# Altium schematic symbol library AA_Symbols.SchLib: 1017 symbols (part 3 of 7) (continued)
## HW_6U_Panel_Generic (continued)
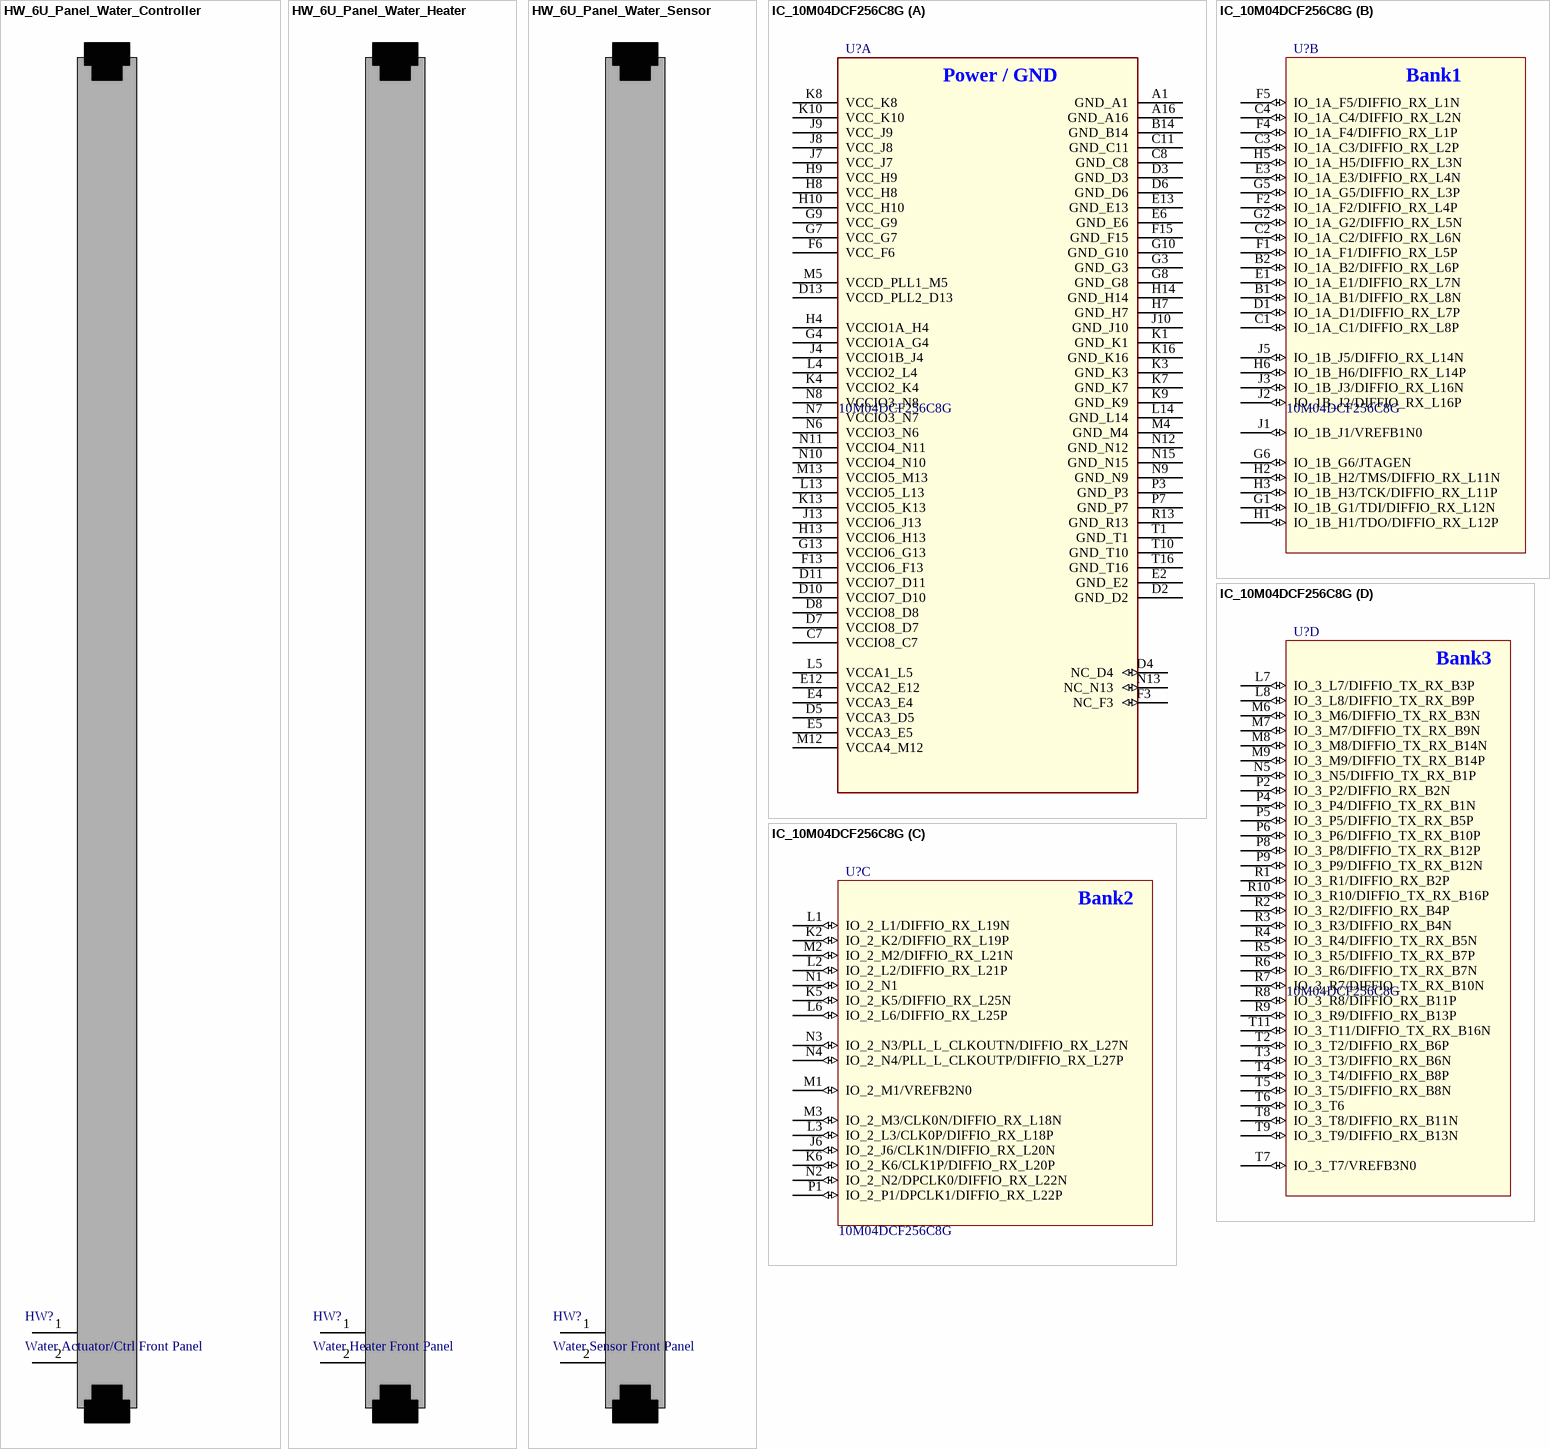
[diagram p14: symbols HW_6U_Panel_Water_Controller to IC_10M04DCF256C8G]

## HW_6U_Panel_Water_Controller
designator HW?, comment Water Actuator/Ctrl Front Panel
Hardware, 6 Rack Unit Tall Front Panel For Water Actuator and Control Card; Outset P/N: PN-0001928
footprint NUV_TPH1R005PL,L1Q_SOTFL127P600X100-8N (Small Outline Transistor Flat Lead (SOP Advance), 1.27 mm pitch; 8 pin, 5.0 mm L X 5.0 mm W X 1.0 mm H body)
footprint 6U_PNL_MTG (Footprint not found)
pins: 1, 2

## HW_6U_Panel_Water_Heater
designator HW?, comment Water Heater Front Panel
Hardware, 6 Rack Unit Tall Front Panel For Water Heater Card, Ejector Handles, Key; Outset P/N: PN-0001927
footprint NUV_TPH1R005PL,L1Q_SOTFL127P600X100-8N (Small Outline Transistor Flat Lead (SOP Advance), 1.27 mm pitch; 8 pin, 5.0 mm L X 5.0 mm W X 1.0 mm H body)
footprint 6U_PNL_MTG (Footprint not found)
pins: 1, 2

## HW_6U_Panel_Water_Sensor
designator HW?, comment Water Sensor Front Panel
Hardware, 6 Rack Unit Tall Front Panel For Water Sensor Card, Ejector Handles, Key; Outset P/N: PN-0001930
footprint NUV_TPH1R005PL,L1Q_SOTFL127P600X100-8N (Small Outline Transistor Flat Lead (SOP Advance), 1.27 mm pitch; 8 pin, 5.0 mm L X 5.0 mm W X 1.0 mm H body)
footprint 6U_PNL_MTG (Footprint not found)
pins: 1, 2

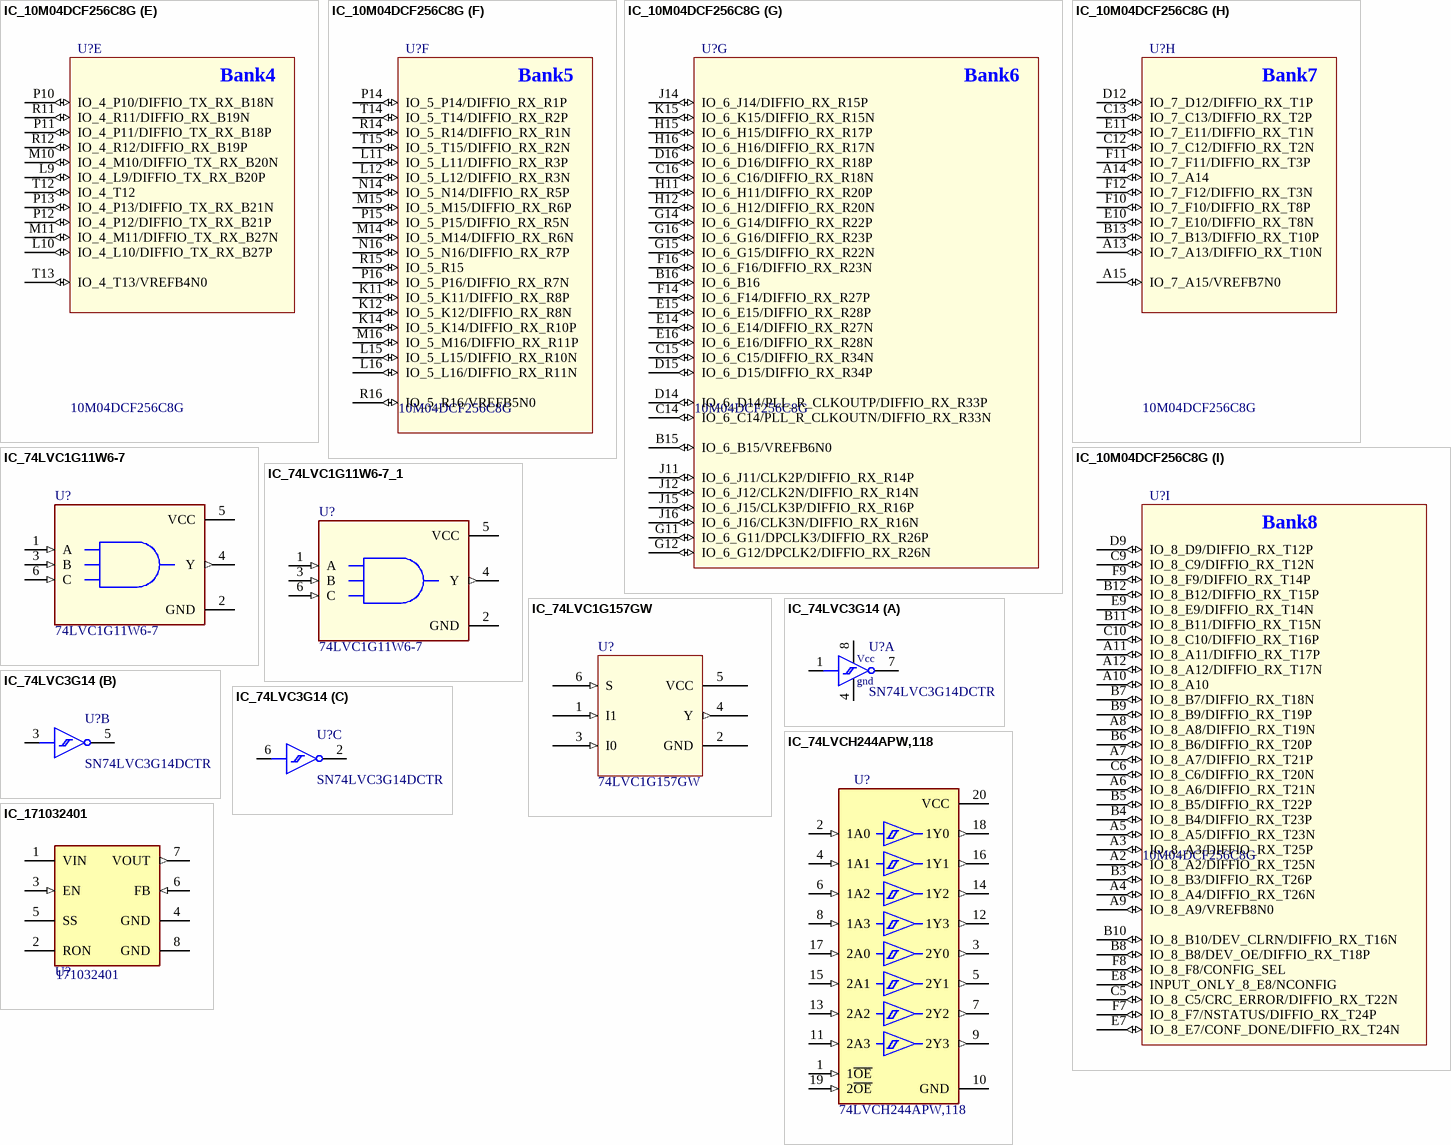
[diagram p15: symbols IC_10M04DCF256C8G to IC_171032401]

## IC_10M04DCF256C8G
designator U?, comment 10M04DCF256C8G
IC, FPGA MAX 10 Family, 256-Pin FBGA, 10M04DCF256C8G; Manufacturer: Intel; Outset P/N: PN-0006891; Manufacturer P/N: 10M04DCF256C8G; VALUE: 10M04DCF256C8G
footprint BGA256CP100_16X16_1700X1700X155B50N
part A pins: A1 GND_A1 (power), A16 GND_A16 (power), B14 GND_B14 (power), C7 VCCIO8_C7 (power), C8 GND_C8 (power), C11 GND_C11 (power), D2 GND_D2 (power), D3 GND_D3 (power), D4 NC_D4 (io), D5 VCCA3_D5 (power), D6 GND_D6 (power), D7 VCCIO8_D7 (power), D8 VCCIO8_D8 (power), D10 VCCIO7_D10 (power), D11 VCCIO7_D11 (power), D13 VCCD_PLL2_D13 (power), E2 GND_E2 (power), E4 VCCA3_E4 (power), E5 VCCA3_E5 (power), E6 GND_E6 (power), E12 VCCA2_E12 (power), E13 GND_E13 (power), F3 NC_F3 (io), F6 VCC_F6 (power), F13 VCCIO6_F13 (power), F15 GND_F15 (power), G3 GND_G3 (power), G4 VCCIO1A_G4 (power), G7 VCC_G7 (power), G8 GND_G8 (power), G9 VCC_G9 (power), G10 GND_G10 (power), G13 VCCIO6_G13 (power), H4 VCCIO1A_H4 (power), H7 GND_H7 (power), H8 VCC_H8 (power), H9 VCC_H9 (power), H10 VCC_H10 (power), H13 VCCIO6_H13 (power), H14 GND_H14 (power), J4 VCCIO1B_J4 (power), J7 VCC_J7 (power), J8 VCC_J8 (power), J9 VCC_J9 (power), J10 GND_J10 (power), J13 VCCIO6_J13 (power), K1 GND_K1 (power), K3 GND_K3 (power), K4 VCCIO2_K4 (power), K7 GND_K7 (power), K8 VCC_K8 (power), K9 GND_K9 (power), K10 VCC_K10 (power), K13 VCCIO5_K13 (power), K16 GND_K16 (power), L4 VCCIO2_L4 (power), L5 VCCA1_L5 (power), L13 VCCIO5_L13 (power), L14 GND_L14 (power), M4 GND_M4 (power), M5 VCCD_PLL1_M5 (power), M12 VCCA4_M12 (power), M13 VCCIO5_M13 (power), N6 VCCIO3_N6 (power), N7 VCCIO3_N7 (power), N8 VCCIO3_N8 (power), N9 GND_N9 (power), N10 VCCIO4_N10 (power), N11 VCCIO4_N11 (power), N12 GND_N12 (power), N13 NC_N13 (io), N15 GND_N15 (power), P3 GND_P3 (power), P7 GND_P7 (power), R13 GND_R13 (power), T1 GND_T1 (power), T10 GND_T10 (power), T16 GND_T16 (power)
part B pins: B1 IO_1A_B1/DIFFIO_RX_L8N (io), B2 IO_1A_B2/DIFFIO_RX_L6P (io), C1 IO_1A_C1/DIFFIO_RX_L8P (io), C2 IO_1A_C2/DIFFIO_RX_L6N (io), C3 IO_1A_C3/DIFFIO_RX_L2P (io), C4 IO_1A_C4/DIFFIO_RX_L2N (io), D1 IO_1A_D1/DIFFIO_RX_L7P (io), E1 IO_1A_E1/DIFFIO_RX_L7N (io), E3 IO_1A_E3/DIFFIO_RX_L4N (io), F1 IO_1A_F1/DIFFIO_RX_L5P (io), F2 IO_1A_F2/DIFFIO_RX_L4P (io), F4 IO_1A_F4/DIFFIO_RX_L1P (io), F5 IO_1A_F5/DIFFIO_RX_L1N (io), G1 IO_1B_G1/TDI/DIFFIO_RX_L12N (io), G2 IO_1A_G2/DIFFIO_RX_L5N (io), G5 IO_1A_G5/DIFFIO_RX_L3P (io), G6 IO_1B_G6/JTAGEN (io), H1 IO_1B_H1/TDO/DIFFIO_RX_L12P (io), H2 IO_1B_H2/TMS/DIFFIO_RX_L11N (io), H3 IO_1B_H3/TCK/DIFFIO_RX_L11P (io), H5 IO_1A_H5/DIFFIO_RX_L3N (io), H6 IO_1B_H6/DIFFIO_RX_L14P (io), J1 IO_1B_J1/VREFB1N0 (io), J2 IO_1B_J2/DIFFIO_RX_L16P (io), J3 IO_1B_J3/DIFFIO_RX_L16N (io), J5 IO_1B_J5/DIFFIO_RX_L14N (io)
part C pins: J6 IO_2_J6/CLK1N/DIFFIO_RX_L20N (io), K2 IO_2_K2/DIFFIO_RX_L19P (io), K5 IO_2_K5/DIFFIO_RX_L25N (io), K6 IO_2_K6/CLK1P/DIFFIO_RX_L20P (io), L1 IO_2_L1/DIFFIO_RX_L19N (io), L2 IO_2_L2/DIFFIO_RX_L21P (io), L3 IO_2_L3/CLK0P/DIFFIO_RX_L18P (io), L6 IO_2_L6/DIFFIO_RX_L25P (io), M1 IO_2_M1/VREFB2N0 (io), M2 IO_2_M2/DIFFIO_RX_L21N (io), M3 IO_2_M3/CLK0N/DIFFIO_RX_L18N (io), N1 IO_2_N1 (io), N2 IO_2_N2/DPCLK0/DIFFIO_RX_L22N (io), N3 IO_2_N3/PLL_L_CLKOUTN/DIFFIO_RX_L27N (io), N4 IO_2_N4/PLL_L_CLKOUTP/DIFFIO_RX_L27P (io), P1 IO_2_P1/DPCLK1/DIFFIO_RX_L22P (io)
part D pins: L7 IO_3_L7/DIFFIO_TX_RX_B3P (io), L8 IO_3_L8/DIFFIO_TX_RX_B9P (io), M6 IO_3_M6/DIFFIO_TX_RX_B3N (io), M7 IO_3_M7/DIFFIO_TX_RX_B9N (io), M8 IO_3_M8/DIFFIO_TX_RX_B14N (io), M9 IO_3_M9/DIFFIO_TX_RX_B14P (io), N5 IO_3_N5/DIFFIO_TX_RX_B1P (io), P2 IO_3_P2/DIFFIO_RX_B2N (io), P4 IO_3_P4/DIFFIO_TX_RX_B1N (io), P5 IO_3_P5/DIFFIO_TX_RX_B5P (io), P6 IO_3_P6/DIFFIO_TX_RX_B10P (io), P8 IO_3_P8/DIFFIO_TX_RX_B12P (io), P9 IO_3_P9/DIFFIO_TX_RX_B12N (io), R1 IO_3_R1/DIFFIO_RX_B2P (io), R2 IO_3_R2/DIFFIO_RX_B4P (io), R3 IO_3_R3/DIFFIO_RX_B4N (io), R4 IO_3_R4/DIFFIO_TX_RX_B5N (io), R5 IO_3_R5/DIFFIO_TX_RX_B7P (io), R6 IO_3_R6/DIFFIO_TX_RX_B7N (io), R7 IO_3_R7/DIFFIO_TX_RX_B10N (io), R8 IO_3_R8/DIFFIO_RX_B11P (io), R9 IO_3_R9/DIFFIO_RX_B13P (io), R10 IO_3_R10/DIFFIO_TX_RX_B16P (io), T2 IO_3_T2/DIFFIO_RX_B6P (io), T3 IO_3_T3/DIFFIO_RX_B6N (io), T4 IO_3_T4/DIFFIO_RX_B8P (io), T5 IO_3_T5/DIFFIO_RX_B8N (io), T6 IO_3_T6 (io), T7 IO_3_T7/VREFB3N0 (io), T8 IO_3_T8/DIFFIO_RX_B11N (io), T9 IO_3_T9/DIFFIO_RX_B13N (io), T11 IO_3_T11/DIFFIO_TX_RX_B16N (io)
part E pins: L9 IO_4_L9/DIFFIO_TX_RX_B20P (io), L10 IO_4_L10/DIFFIO_TX_RX_B27P (io), M10 IO_4_M10/DIFFIO_TX_RX_B20N (io), M11 IO_4_M11/DIFFIO_TX_RX_B27N (io), P10 IO_4_P10/DIFFIO_TX_RX_B18N (io), P11 IO_4_P11/DIFFIO_TX_RX_B18P (io), P12 IO_4_P12/DIFFIO_TX_RX_B21P (io), P13 IO_4_P13/DIFFIO_TX_RX_B21N (io), R11 IO_4_R11/DIFFIO_RX_B19N (io), R12 IO_4_R12/DIFFIO_RX_B19P (io), T12 IO_4_T12 (io), T13 IO_4_T13/VREFB4N0 (io)
part F pins: K11 IO_5_K11/DIFFIO_RX_R8P (io), K12 IO_5_K12/DIFFIO_RX_R8N (io), K14 IO_5_K14/DIFFIO_RX_R10P (io), L11 IO_5_L11/DIFFIO_RX_R3P (io), L12 IO_5_L12/DIFFIO_RX_R3N (io), L15 IO_5_L15/DIFFIO_RX_R10N (io), L16 IO_5_L16/DIFFIO_RX_R11N (io), M14 IO_5_M14/DIFFIO_RX_R6N (io), M15 IO_5_M15/DIFFIO_RX_R6P (io), M16 IO_5_M16/DIFFIO_RX_R11P (io), N14 IO_5_N14/DIFFIO_RX_R5P (io), N16 IO_5_N16/DIFFIO_RX_R7P (io), P14 IO_5_P14/DIFFIO_RX_R1P (io), P15 IO_5_P15/DIFFIO_RX_R5N (io), P16 IO_5_P16/DIFFIO_RX_R7N (io), R14 IO_5_R14/DIFFIO_RX_R1N (io), R15 IO_5_R15 (io), R16 IO_5_R16/VREFB5N0 (io), T14 IO_5_T14/DIFFIO_RX_R2P (io), T15 IO_5_T15/DIFFIO_RX_R2N (io)
part G pins: B15 IO_6_B15/VREFB6N0 (io), B16 IO_6_B16 (io), C14 IO_6_C14/PLL_R_CLKOUTN/DIFFIO_RX_R33N (io), C15 IO_6_C15/DIFFIO_RX_R34N (io), C16 IO_6_C16/DIFFIO_RX_R18N (io), D14 IO_6_D14/PLL_R_CLKOUTP/DIFFIO_RX_R33P (io), D15 IO_6_D15/DIFFIO_RX_R34P (io), D16 IO_6_D16/DIFFIO_RX_R18P (io), E14 IO_6_E14/DIFFIO_RX_R27N (io), E15 IO_6_E15/DIFFIO_RX_R28P (io), E16 IO_6_E16/DIFFIO_RX_R28N (io), F14 IO_6_F14/DIFFIO_RX_R27P (io), F16 IO_6_F16/DIFFIO_RX_R23N (io), G11 IO_6_G11/DPCLK3/DIFFIO_RX_R26P (io), G12 IO_6_G12/DPCLK2/DIFFIO_RX_R26N (io), G14 IO_6_G14/DIFFIO_RX_R22P (io), G15 IO_6_G15/DIFFIO_RX_R22N (io), G16 IO_6_G16/DIFFIO_RX_R23P (io), H11 IO_6_H11/DIFFIO_RX_R20P (io), H12 IO_6_H12/DIFFIO_RX_R20N (io), H15 IO_6_H15/DIFFIO_RX_R17P (io), H16 IO_6_H16/DIFFIO_RX_R17N (io), J11 IO_6_J11/CLK2P/DIFFIO_RX_R14P (io), J12 IO_6_J12/CLK2N/DIFFIO_RX_R14N (io), J14 IO_6_J14/DIFFIO_RX_R15P (io), J15 IO_6_J15/CLK3P/DIFFIO_RX_R16P (io), J16 IO_6_J16/CLK3N/DIFFIO_RX_R16N (io), K15 IO_6_K15/DIFFIO_RX_R15N (io)
part H pins: A13 IO_7_A13/DIFFIO_RX_T10N (io), A14 IO_7_A14 (io), A15 IO_7_A15/VREFB7N0 (io), B13 IO_7_B13/DIFFIO_RX_T10P (io), C12 IO_7_C12/DIFFIO_RX_T2N (io), C13 IO_7_C13/DIFFIO_RX_T2P (io), D12 IO_7_D12/DIFFIO_RX_T1P (io), E10 IO_7_E10/DIFFIO_RX_T8N (io), E11 IO_7_E11/DIFFIO_RX_T1N (io), F10 IO_7_F10/DIFFIO_RX_T8P (io), F11 IO_7_F11/DIFFIO_RX_T3P (io), F12 IO_7_F12/DIFFIO_RX_T3N (io)
part I pins: A2 IO_8_A2/DIFFIO_RX_T25N (io), A3 IO_8_A3/DIFFIO_RX_T25P (io), A4 IO_8_A4/DIFFIO_RX_T26N (io), A5 IO_8_A5/DIFFIO_RX_T23N (io), A6 IO_8_A6/DIFFIO_RX_T21N (io), A7 IO_8_A7/DIFFIO_RX_T21P (io), A8 IO_8_A8/DIFFIO_RX_T19N (io), A9 IO_8_A9/VREFB8N0 (io), A10 IO_8_A10 (io), A11 IO_8_A11/DIFFIO_RX_T17P (io), A12 IO_8_A12/DIFFIO_RX_T17N (io), B3 IO_8_B3/DIFFIO_RX_T26P (io), B4 IO_8_B4/DIFFIO_RX_T23P (io), B5 IO_8_B5/DIFFIO_RX_T22P (io), B6 IO_8_B6/DIFFIO_RX_T20P (io), B7 IO_8_B7/DIFFIO_RX_T18N (io), B8 IO_8_B8/DEV_OE/DIFFIO_RX_T18P (io), B9 IO_8_B9/DIFFIO_RX_T19P (io), B10 IO_8_B10/DEV_CLRN/DIFFIO_RX_T16N (io), B11 IO_8_B11/DIFFIO_RX_T15N (io), B12 IO_8_B12/DIFFIO_RX_T15P (io), C5 IO_8_C5/CRC_ERROR/DIFFIO_RX_T22N (io), C6 IO_8_C6/DIFFIO_RX_T20N (io), C9 IO_8_C9/DIFFIO_RX_T12N (io), C10 IO_8_C10/DIFFIO_RX_T16P (io), D9 IO_8_D9/DIFFIO_RX_T12P (io), E7 IO_8_E7/CONF_DONE/DIFFIO_RX_T24N (io), E8 INPUT_ONLY_8_E8/NCONFIG (io), E9 IO_8_E9/DIFFIO_RX_T14N (io), F7 IO_8_F7/NSTATUS/DIFFIO_RX_T24P (io), F8 IO_8_F8/CONFIG_SEL (io), F9 IO_8_F9/DIFFIO_RX_T14P (io)
part A text: Power / GND
part B text: Bank1
part C text: Bank2
part D text: Bank3
part E text: Bank4
part F text: Bank5
part G text: Bank6
part H text: Bank7
part I text: Bank8

## IC_74LVC1G11W6-7
designator U?, comment 74LVC1G11W6-7
IC, AND Gate IC 1 Channel, 3 input, SOT-26; Manufacturer: Diodes Inc; Outset P/N: PN-0008391; Manufacturer P/N: 74LVC1G11W6-7; Value: 74LVC1G11W6-7
footprint SOT23-6P95_285X140L45X42N (Small Outline Transistor, SOT-23 Type, 0.95 mm pitch; 6 pin, 3.00 mm L X 1.60 mm W X 1.40 mm H body)
pins: 1 A (in), 2 GND (power), 3 B (in), 4 Y (out), 5 VCC (power), 6 C (in)

## IC_74LVC1G11W6-7_1
designator U?, comment 74LVC1G11W6-7
IC, AND Gate IC 1 Channel, 3 input, SOT-26; Manufacturer: Diodes Inc; Manufacturer P/N: 74LVC1G11W6-7; Value: 74LVC1G11W6-7
footprint SOT23_5PIN (SOT23, 5-Leads, Body 3.0x3.0mm (max), Pitch 0.95mm, IPC Medium Density)
pins: 1 A (in), 2 GND (power), 3 B (in), 4 Y (out), 5 VCC (power), 6 C (in)

## IC_74LVC1G157GW
designator U?, comment 74LVC1G157GW
IC, 2 Input Multiplexer, 74LVC1G157GW, SOT363; Manufacturer: NXP Semiconductors; Outset P/N: PN-0001645; Value: 74LVC1G157GW; Manufacturer P/N: 74LVC1G157GW
footprint 74LVC1G157GW_SOT363P210X110-6L30N (Small Outline Transistor (SOT), 0.65 mm pitch; 6 pin, 2.00 mm L X 1.25 mm W X 1.10 mm H body)
pins: 1 I1 (in), 2 GND (power), 3 I0 (in), 4 Y (out), 5 VCC (power), 6 S (in)

## IC_74LVC3G14
designator U?, comment SN74LVC3G14DCTR
IC, Schmitt-Trigger Inverter, Tripple; Manufacturer: Texas Instruments; Outset P/N: 0000104; Manufacturer P/N: SN74LVC3G14DCTR
footprint DCT8
part A pins: 1, 4 GND, 7, 8 VCC
part B pins: 3, 5
part C pins: 2, 6
part A text: Vcc; gnd

## IC_74LVCH244APW,118
designator U?, comment 74LVCH244APW,118
Buffer, Non-Inverting, 2 x 4 Bit, 3-State Output 20-TSSOP; Manufacturer: Nexperia USA Inc.; Outset P/N: PN-0008320; Manufacturer P/N: 74LVCH244APW,118; Value: 74LVCH244APW,118
footprint SOP20P65_650X640X120L62X24N (PW_MO-153) (Small Outline Pkg (SOP), 0.65 mm pitch; 20 pin, 6.50 mm L X 4.40 mm W X 1.20 mm H body)
pins: 1 1~{OE} (in), 2 1A0 (in), 3 2Y0 (out), 4 1A1 (in), 5 2Y1 (out), 6 1A2 (in), 7 2Y2 (out), 8 1A3 (in), 9 2Y3 (out), 10 GND (power), 11 2A3 (in), 12 1Y3 (out), 13 2A2 (in), 14 1Y2 (out), 15 2A1 (in), 16 1Y1 (out), 17 2A0 (in), 18 1Y0 (out), 19 2~{OE} (in), 20 VCC (power)

## IC_171032401
designator U?, comment 171032401
IC, DC/DC Converter, Non-Isolated PoL Module, 6-42V Input, 5-24V Output, 3A, Surface Mount, 7-SMD Module; Manufacturer: Wurth Elektronik; Outset P/N: PN-0007275; Temperature: -40C ~ 85C; Manufacturer P/N: 171032401; Value: 171032401
footprint TZA07A_V
pins: 1 VIN (power), 2 RON, 3 EN (in), 4 GND (power), 5 SS, 6 FB (in), 7 VOUT (out), 8 GND

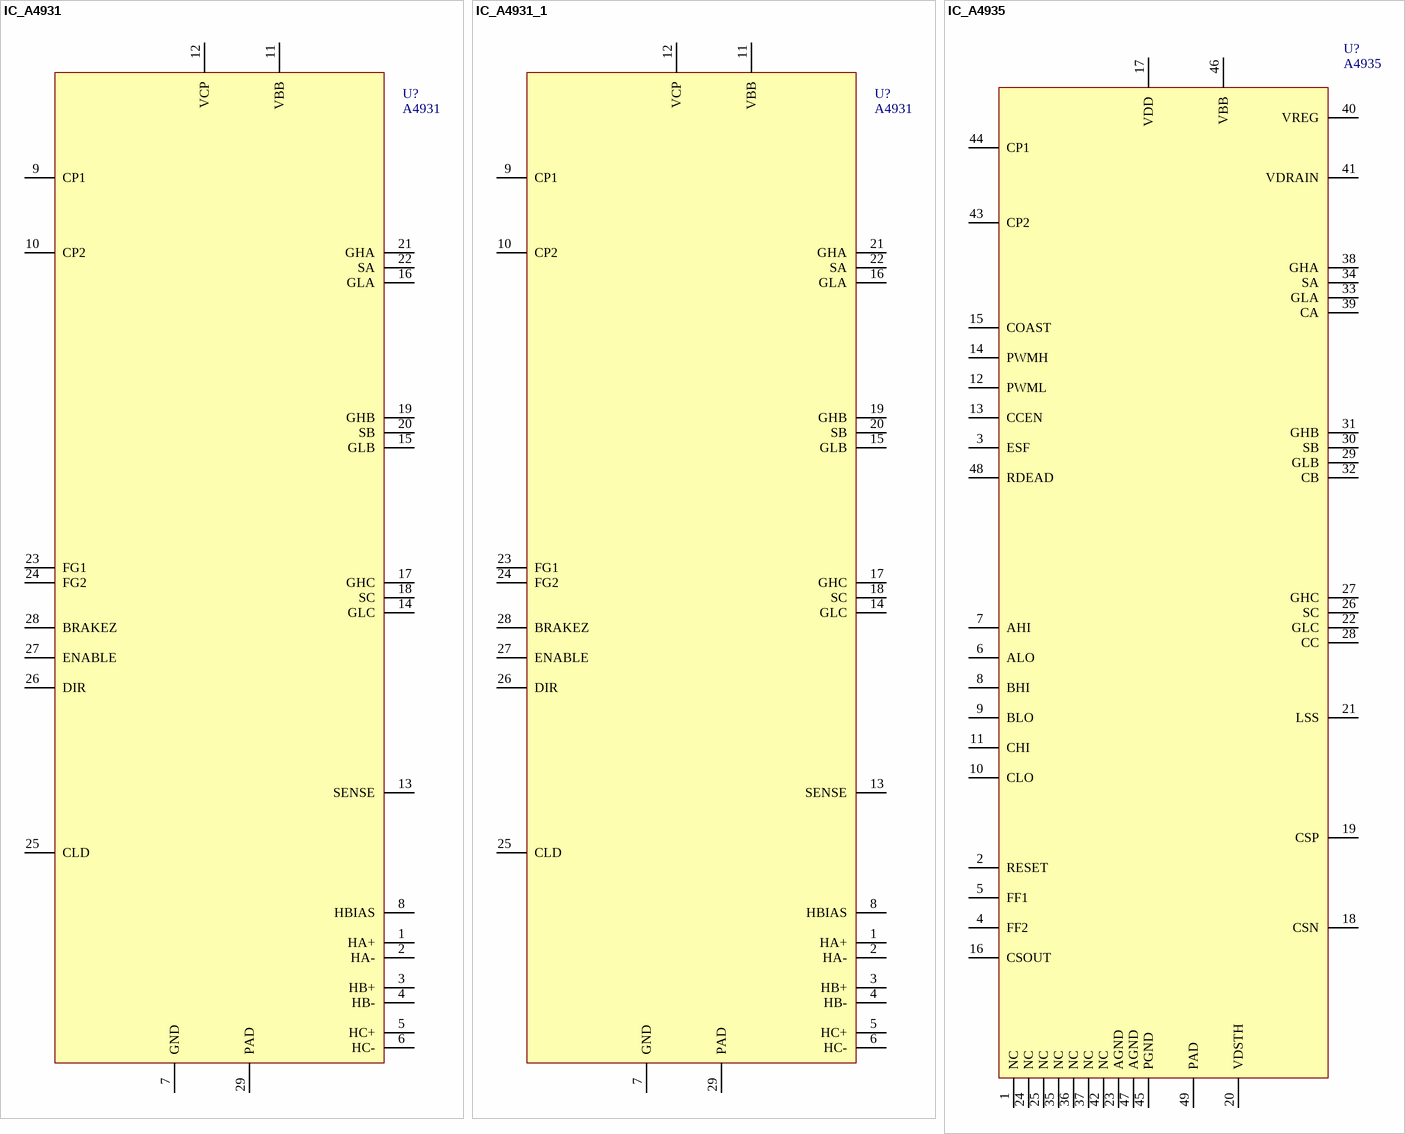
[diagram p16: symbols IC_A4931 to IC_A4935]

## IC_A4931
designator U?, comment A4931
IC, 3-Phase Brushless DC Motor Pre-driver; Manufacturer: Allegro Microsystems Inc; Outset P/N: 0000105; Manufacturer P/N: A4931
footprint QFN_28Pin (CQFP, 28-Leads, Pitch 1.27mm, Gullwing Leadform, IPC High Density)
pins: 1 HA+, 2 HA-, 3 HB+, 4 HB-, 5 HC+, 6 HC-, 7 GND (power), 8 HBIAS, 9 CP1, 10 CP2, 11 VBB (power), 12 VCP (power), 13 SENSE, 14 GLC, 15 GLB, 16 GLA, 17 GHC, 18 SC, 19 GHB, 20 SB, 21 GHA, 22 SA, 23 FG1, 24 FG2, 25 CLD, 26 DIR, 27 ENABLE, 28 BRAKEZ, 29 PAD (power)

## IC_A4931_1
designator U?, comment A4931
IC, 3-Phase Brushless DC Motor Pre-driver; Manufacturer: Allegro Microsystems Inc; Outset P/N: PN-0000105; Manufacturer P/N: A4931
footprint QFN_28Pin (CQFP, 28-Leads, Pitch 1.27mm, Gullwing Leadform, IPC High Density)
pins: 1 HA+, 2 HA-, 3 HB+, 4 HB-, 5 HC+, 6 HC-, 7 GND (power), 8 HBIAS, 9 CP1, 10 CP2, 11 VBB (power), 12 VCP (power), 13 SENSE, 14 GLC, 15 GLB, 16 GLA, 17 GHC, 18 SC, 19 GHB, 20 SB, 21 GHA, 22 SA, 23 FG1, 24 FG2, 25 CLD, 26 DIR, 27 ENABLE, 28 BRAKEZ, 29 PAD (power)

## IC_A4935
designator U?, comment A4935
IC, MOSFET Driver, 3-Phase, Automotive, 48-LQFP; Manufacturer: Allegro Microsystems Inc; Manufacturer P/N: A4935KJPTR-T; Outset P/N: 0000106
footprint LQFP_48PIN (QFP; 48 Leads; Body 7 x 7 mm; Pitch 0.5 mm)
pins: 1 NC, 2 RESET, 3 ESF, 4 FF2, 5 FF1, 6 ALO, 7 AHI, 8 BHI, 9 BLO, 10 CLO, 11 CHI, 12 PWML, 13 CCEN, 14 PWMH, 15 COAST, 16 CSOUT, 17 VDD (power), 18 CSN, 19 CSP, 20 VDSTH, 21 LSS, 22 GLC, 23 AGND (power), 24 NC, 25 NC, 26 SC, 27 GHC, 28 CC, 29 GLB, 30 SB, 31 GHB, 32 CB, 33 GLA, 34 SA, 35 NC, 36 NC, 37 NC, 38 GHA, 39 CA, 40 VREG (power), 41 VDRAIN, 42 NC, 43 CP2, 44 CP1, 45 PGND (power), 46 VBB (power), 47 AGND (power), 48 RDEAD, 49 PAD (power)

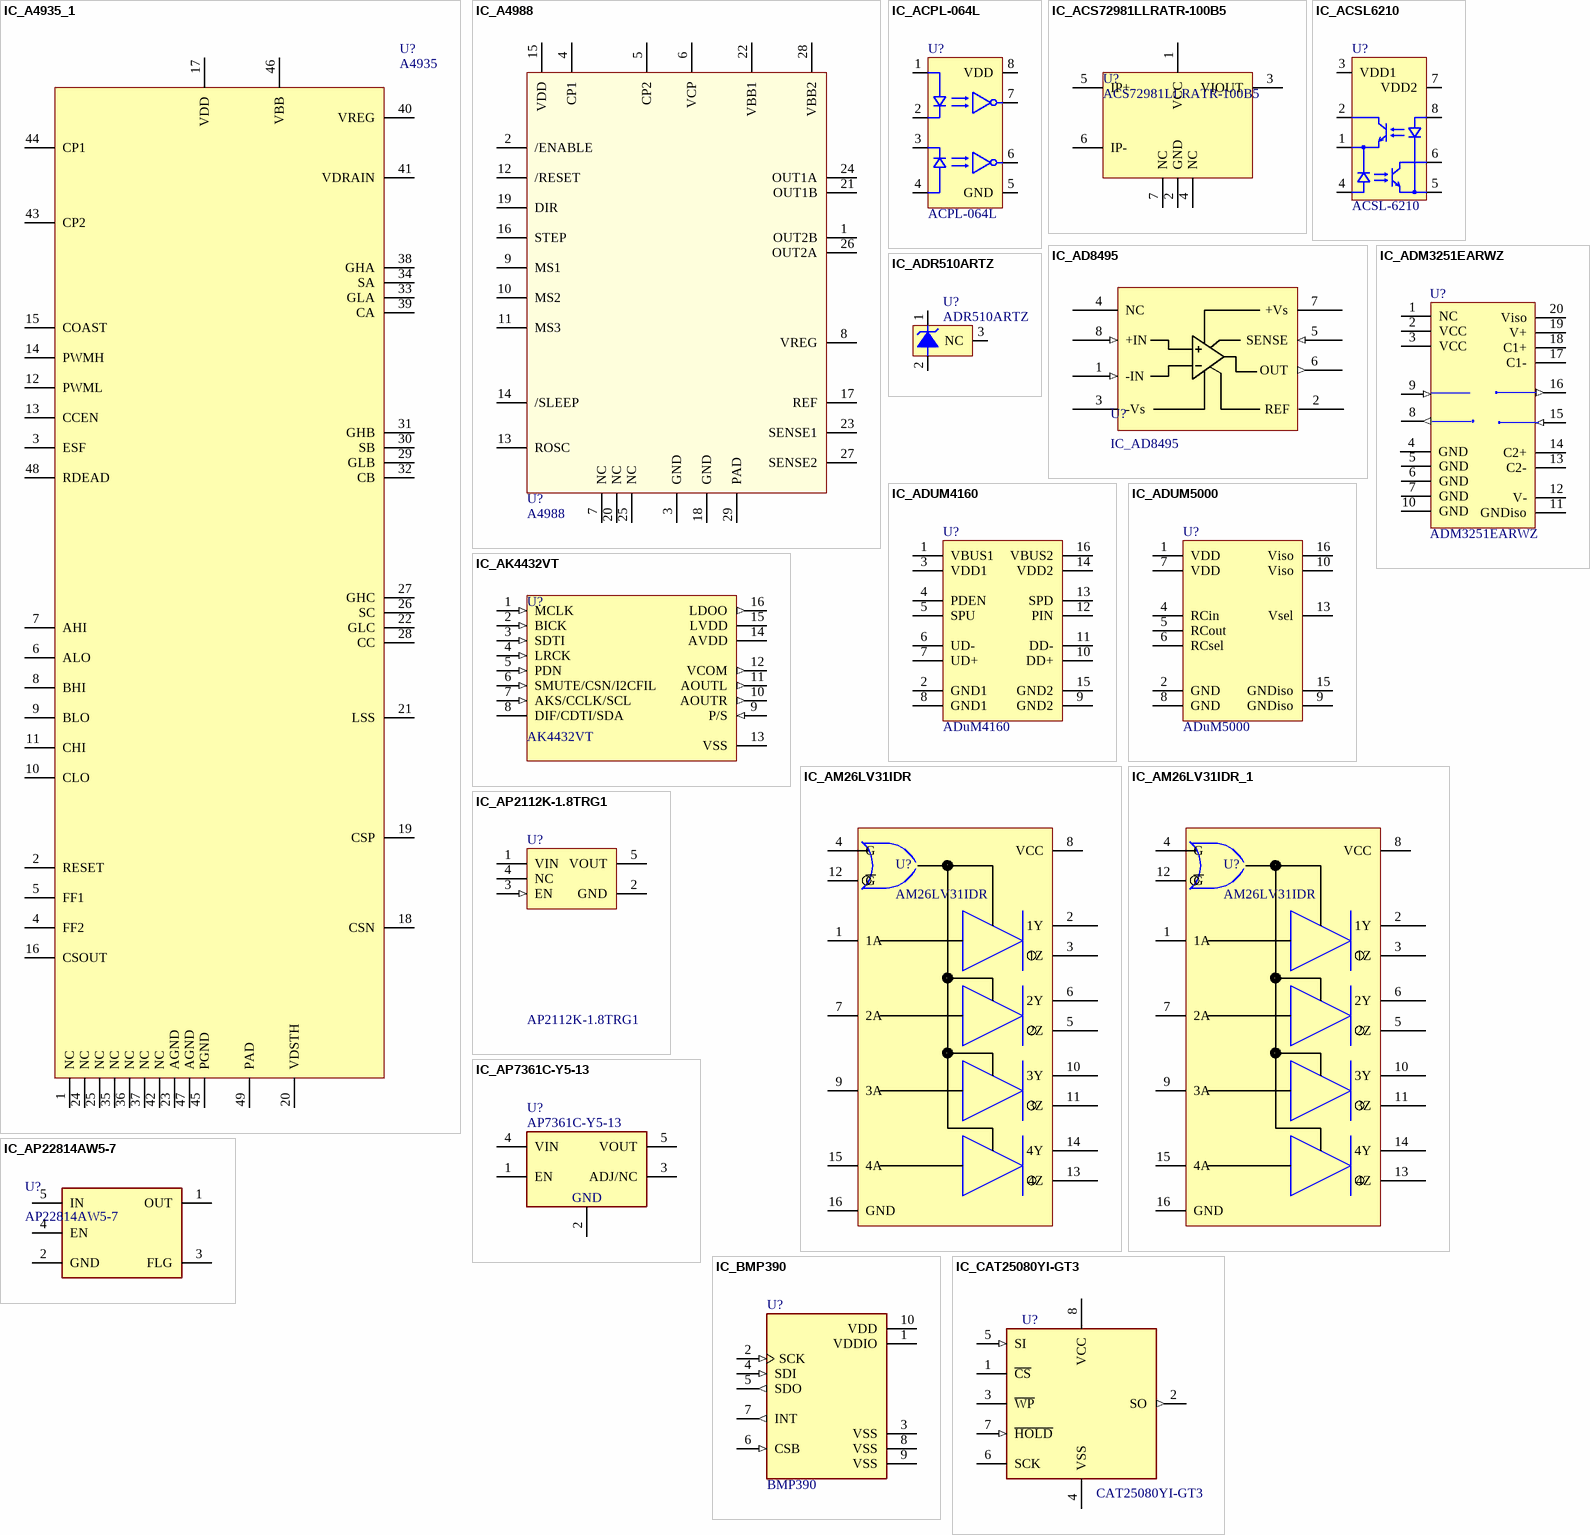
[diagram p17: symbols IC_A4935_1 to IC_CAT25080YI-GT3]

## IC_A4935_1
designator U?, comment A4935
IC, MOSFET Driver, 3-Phase, Automotive, 48-LQFP; Manufacturer: Allegro Microsystems Inc; Manufacturer P/N: A4935KJPTR-T; Outset P/N: 0000106
footprint LQFP_48PIN (QFP; 48 Leads; Body 7 x 7 mm; Pitch 0.5 mm)
pins: 1 NC, 2 RESET, 3 ESF, 4 FF2, 5 FF1, 6 ALO, 7 AHI, 8 BHI, 9 BLO, 10 CLO, 11 CHI, 12 PWML, 13 CCEN, 14 PWMH, 15 COAST, 16 CSOUT, 17 VDD (power), 18 CSN, 19 CSP, 20 VDSTH, 21 LSS, 22 GLC, 23 AGND (power), 24 NC, 25 NC, 26 SC, 27 GHC, 28 CC, 29 GLB, 30 SB, 31 GHB, 32 CB, 33 GLA, 34 SA, 35 NC, 36 NC, 37 NC, 38 GHA, 39 CA, 40 VREG (power), 41 VDRAIN, 42 NC, 43 CP2, 44 CP1, 45 PGND (power), 46 VBB (power), 47 AGND (power), 48 RDEAD, 49 PAD (power)

## IC_A4988
designator U?, comment A4988
IC, Stepper Driver, 28QFN; Manufacturer: Allegro Microsystems Inc; Manufacturer P/N: A4988SETTR-T; Outset P/N: 0000107
footprint QFN_28Pin (CQFP, 28-Leads, Pitch 1.27mm, Gullwing Leadform, IPC High Density)
pins: 1 OUT2B, 2 /ENABLE, 3 GND, 4 CP1, 5 CP2, 6 VCP, 7 NC, 8 VREG, 9 MS1, 10 MS2, 11 MS3, 12 /RESET, 13 ROSC, 14 /SLEEP, 15 VDD, 16 STEP, 17 REF, 18 GND, 19 DIR, 20 NC, 21 OUT1B, 22 VBB1, 23 SENSE1, 24 OUT1A, 25 NC, 26 OUT2A, 27 SENSE2, 28 VBB2, 29 PAD

## IC_ACPL-064L
designator U?, comment ACPL-064L
IC, Optocoupler, 2 Channel, CMOS, SOIC-8; Manufacturer: Avago Technologies US Inc.; Manufacturer P/N: ACPL-064L-000E; Outset P/N: 0000108
footprint SOIC_8PIN-4MM
pins: 1 A1, 2 K1, 3 K2, 4 A2, 5 GND, 6 VO2, 7 VO1, 8 VDD

## IC_ACS72981LLRATR-100B5
designator U?, comment ACS72981LLRATR-100B5
IC, Hall Effect Sensor, 7-PowerSMD; Outset P/N: PN-0006952; Manufacturer P/N: ACS72981LLRATR-100B5
footprint PSOF7_ACS72981LLRATR-100B5_ALM
pins: 1 VCC, 2 GND, 3 VIOUT, 4 NC, 5 IP+, 6 IP-, 7 NC

## IC_ACSL6210
designator U?, comment ACSL-6210
IC, Optocoupler, 2 Channel, Bi-Directional, SOIC-8; Manufacturer: Avago Technologies US Inc.; Manufacturer P/N: ACSL-6210-00RE; Outset P/N: 0000109
footprint SOIC_8PIN-4MM_CLEARANCE
pins: 1 GND1, 2 VO1, 3 VDD1, 4 A2, 5 GND2, 6 VO2, 7 VDD2, 8 A1

## IC_AD8495
designator U?
IC, Thermocouple Amp w/ CJC, 8MSOP; Manufacturer: Analog Devices; Manufacturer P/N: AD8495CRMZ; Outset P/N: PN-0003019
footprint MSOP_8PIN (MSOP, 8-Leads, Body 3.1x3.1mm (max), Pitch 0.65mm, IPC Medium Density)
pins: 1 -IN (in), 2 REF, 3 -Vs (power), 4 NC, 5 SENSE (in), 6 OUT (out), 7 +Vs (power), 8 +IN (in)

## IC_ADM3251EARWZ
designator U?, comment ADM3251EARWZ
IC, Isolated RS-232 Transceiver; Manufacturer: Analog Devices; Outset P/N: 0000110; Manufacturer P/N: ADM3251EARWZ
footprint SOIC_20PIN_WIDE
pins: 1 NC, 2 VCC (power), 3 VCC, 4 GND, 5 GND, 6 GND (power), 7 GND (power), 8 R2IN (out), 9 Rout (in), 10 GND (power), 11 GNDiso (power), 12 V- (power), 13 C2-, 14 C2+, 15 Rin (in), 16 Tout (out), 17 C1- (power), 18 C1+ (power), 19 V+ (power), 20 Viso (power)

## IC_ADR510ARTZ
designator U?, comment ADR510ARTZ
IC, Voltage Reference, 1V, SOT23-3; Manufacturer: Analog Devices; Manufacturer P/N: ADR510ARTZ-REEL7; Outset P/N: PN-0003022
footprint SOT-23 (SOT-23; 3 Leads; Body 3.0 x 2.6 mm, inc. leads (LxW max))
pins: 1 +V, 2 -V, 3 NC
